# Altium footprint library PCBLIB.PcbLib: 557 footprints (part 8 of 36)
Each footprint in its own frame and in the unit in brackets; x right, y up, seen from the top. Pads: shape width x height; smd on the part's side, far side on the other; paste and mask are expansions set on the pad; w line width, h text height; cw(c..) or ccw(c..) is an arc to the next point about the centre after c.
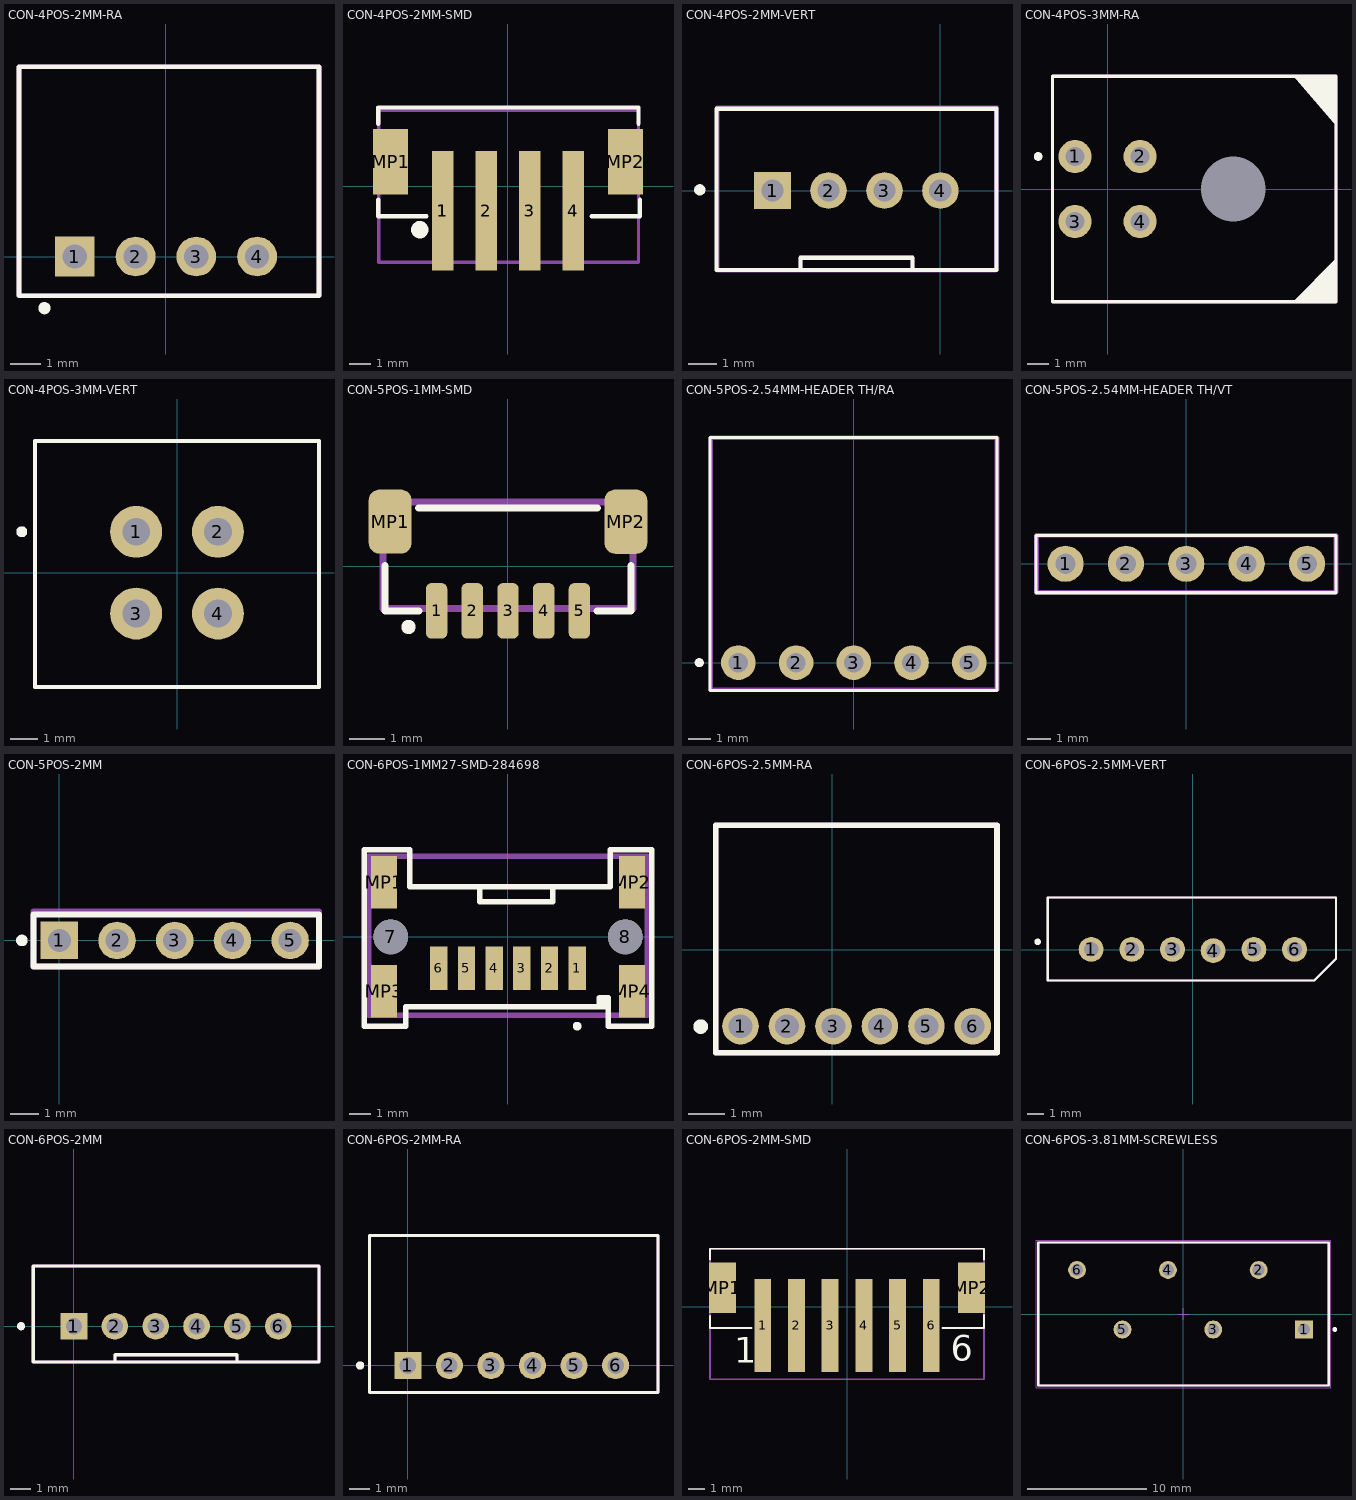
[diagram p7: the footprints below, top view; thin cyan lines are the x and y axes]

## CON-4POS-2MM-RA [mm]
pads (4):
  rect 1.308x1.308 hole 0.8: 1(-3,0)
  round 1.308 hole 0.8: 2(-1,0) 3(1,0) 4(3,0)
Top Overlay:
  circle w0.2: c-4,-1.7 r0.1
  lines w0.152: -4.838,-1.295 -4.838,6.248 5.039,6.248 5.039,-1.295 -4.838,-1.295
ASM Top:
  lines w0.152: -4.838,6.198 -4.788,6.248 5.039,6.248 5.039,-1.295 -4.838,-1.295 -4.838,6.248
  text ".designator" at -0.368,2.184 h0.8
3D body "S4B-PH-K-S.STEP": height 4.81, standoff -3.39, extent -4.861,-1.377 5.039,6.223

## CON-4POS-2MM-SMD [mm]
pads (7):
  rect 1x5.5 smd: 1(-3,-1.125) 1(-3,-1.125) 2(-1,-1.125) 3(1,-1.125) 4(3,-1.125)
  rect 1.6x3 smd: MP1(-5.4,1.125) MP2(5.4,1.125)
Top Overlay:
  circle w0.4: c-4.058,-1.999 r0.2
  lines w0.2: -5.975,-0.625 -5.975,-1.375 -3.75,-1.375 ; -5.975,2.875 -5.975,3.625 6,3.625 6,2.875 ; 3.85,-1.375 6.075,-1.375 6.075,-0.625
ASM Top:
  lines w0.152: -5.95,3.5 -5.95,-3.5 6,-3.5 6,3.5 ; -5.95,3.5 -5.95,3.5 ; -5.95,3.5 6,3.5 ; 6,3.5 6,3.5
  text ".designator" at -2.4,-0.4 h0.8
3D body "B4B-PH-SM4-TB.STEP": height 6.61, standoff 0.01, extent -5.95,-3.5 6,3.5

## CON-4POS-2MM-VERT [mm]
pads (4):
  rect 1.308x1.308 hole 0.8: 1(-6,0)
  round 1.308 hole 0.8: 2(-4,0) 3(-2,0) 4(0,0)
Top Overlay:
  circle w0.2: c-8.6,0.025 r0.1
  lines w0.15: -5,-2.845 -8,-2.845 -8,2.921 2,2.921 2,-2.845 -1,-2.845 ; -5,-2.845 -1,-2.845 ; -5,-2.845 -5,-2.4 -3.8,-2.4 -2.2,-2.4 -1,-2.4 -1,-2.845
ASM Top:
  lines w0.15: -5,-2.845 -5,-2.4 -1,-2.4 -1,-2.845
  lines w0.152: 1.97,-2.845 1.996,-2.819 ; 1.97,-2.845 -7.978,-2.845 -7.978,2.955 2.022,2.955 1.996,2.93 1.996,-2.819 ; 1.97,-2.845 1.996,-2.819
  text ".designator" at -4.727,-0.457 h0.8
3D body "c-1735446-4-c-3d.stp": height 6.1, standoff -3.37, extent -7.974,-2.844 2.026,2.956

## CON-4POS-3MM-RA [mil]
pads (5):
  round 60 hole 35: 1(-59.06,59.06) 2(59.06,59.06) 3(-59.06,-59.06) 4(59.06,-59.06)
  round 1 hole 118 unplated: MH1(228.35,0)
Top Overlay:
  circle w7.87: c-125.98,59.06 r3.94
  region: 415,-127 415,-205 337,-205
  region: 338.66,205 415,205 415,114.67
  lines w6: 345,205 415,205 ; 355,205 415,205 ; 415,205 -100,205 -100,-60 -100,-205 415,-205 415,205
ASM Top:
  lines w6: -100,-205 415,-205 415,205 -100,205 -100,-60 -100,-205
  text ".designator" at -55,114 h31.5
3D body "430450400.stp": height 340.35, standoff -130.12, extent -70,-199 411.89,200.6

## CON-4POS-3MM-VERT [mm]
pads (4):
  round 1.905 hole 1.016: 1(-1.5,1.5) 2(1.5,1.5) 3(-1.5,-1.5) 4(1.5,-1.5)
Top Overlay:
  circle w0.2: c-5.7,1.5 r0.1
  lines w0.152: -5.207,-4.191 5.207,-4.191 5.207,4.826 -5.207,4.826 -5.207,-4.191
ASM Top:
  lines w0.152: -5.207,-4.191 -5.207,4.826 5.207,4.826 5.207,-4.191 -5.207,-4.191
  text ".designator" at -4.775,2.718 h0.8
3D body "430450412.stp": height 10.03, standoff -3.06, extent -5.07,-4.064 5.08,4.706

## CON-5POS-1MM-SMD [mm]
pads (7):
  rrect50% 0.6x1.55 smd mask+0.05: 1(-2,-1.25) 2(-1,-1.25) 3(0,-1.25) 4(1,-1.25) 5(2,-1.25)
  rrect50% 1.2x1.8 smd mask+0.05: MP1(-3.3,1.25) MP2(3.3,1.249)
Top Overlay:
  circle w0.2: c-2.788,-1.7 r0.1
  lines w0.2: -3.442,0.015 -3.442,-1.251 -2.5,-1.251 ; -2.5,1.631 2.5,1.631 ; 2.5,-1.251 3.44,-1.251 ; 3.441,-1.253 3.441,0.013
ASM Top:
  lines w0.2: -3.5,-1.2 -3.5,1.8 3.5,1.8 3.5,-1.2 3.485,-1.185 -3.5,-1.185
  text ".designator" at -1.3,0 h0.8
3D body "5013310507.stp": height 5.5, standoff -0.04, extent -3.62,-1.91 3.62,1.94

## CON-5POS-2.54MM-HEADER TH/RA [mil]
pads (5):
  round 60 hole 33.46: 1(-200,0) 2(-100,0) 3(0,0) 4(100,0) 5(200,0)
Top Overlay:
  circle w7.87: c-267.72,0 r3.94
  lines w5: -249,-48 248,-48 248,389.76 -249,389.76 -249,-48
ASM Top:
  lines w7.87: -248.03,389.57 247.84,389.57 248.03,389.76 248.03,-47.24 -248.03,-47.24 -248.03,389.76
  text ".designator" at -51.18,188.98 h31.5
3D body "TSW-105-08-G-S-RA.stp": height 119.5, standoff -89.5, extent -250,-13.44 250,389.06

## CON-5POS-2.54MM-HEADER TH/VT [mil]
pads (5):
  round 60 hole 33.46: 1(-200,0) 2(-100,0) 3(0,0) 4(100,0) 5(200,0)
Top Overlay:
  lines w5: -249,-48 -249,47 248,47 248,-48 -249,-48
ASM Top:
  lines w7.87: -248.03,-47.24 -248.03,47.24 248.03,47.24 248.03,-47.24 -248.03,-47.24
  text ".designator" at -43.31,-11.81 h31.5
3D body "Header_Male_5Pin.STEP": height 336.22, standoff -118.11, extent -251,-50 249,48.03

## CON-5POS-2MM [mm] "Connector; Header; 5 Position"
pads (5):
  rect 1.3x1.3 hole 0.8: 1(0,0)
  round 1.3 hole 0.8: 2(2,0) 3(4,0) 4(6,0) 5(8,0)
Top Overlay:
  circle w0.2: c-1.3,0 r0.1
  lines w0.2: -0.9,-0.9 9,-0.9 9,0.9 -0.9,0.9 -0.9,-0.9
ASM Top:
  lines w0.2: -0.9,-0.9 9,-0.9 9,1 -0.9,1 -0.9,-0.9
  text ".designator" at 3.372,-0.169 h0.8

## CON-6POS-1MM27-SMD-284698 [mm] "ERNI 284698"
height 5.25
pads (12):
  rect 0.8x2 smd: 1(3.175,-1.45) 2(1.905,-1.45) 3(0.635,-1.45) 4(-0.635,-1.45) 5(-1.905,-1.45) 6(-3.175,-1.45)
  round 1.6 hole 1.6 unplated: 7(-5.385,0) 8(5.385,0)
  rect 1.2x2.4 smd: MP1(-5.685,2.5) MP2(5.685,2.5) MP3(-5.685,-2.5) MP4(5.685,-2.5)
Top Overlay:
  circle w0.2: c3.175,-4.1 r0.1
  lines w0.254: -1.305,2.3 -1.305,1.6 2.062,1.6 2.062,2.3 ; 4.16,-3.2 4.2,-3.2 4.2,-2.8 4.6,-2.8 4.6,-3.2 ; 4.4,-3 4.6,-3 4.6,-3.2 ; 4.6,-3.2 4.6,-4.1 6.6,-4.1 6.6,4 4.7,4 4.7,2.3 -4.5,2.3 -4.5,4 -6.6,4 -6.6,-4.1 -4.7,-4.1 -4.7,-3.2 4.6,-3.2
ASM Top:
  lines w0.254: -6.4,-3.6 6.4,-3.6 6.4,3.7 -6.4,3.7 -6.4,-3.6
  text ".designator" at -3.6,0.4 h0.8
3D body "284698.STEP": height 5.2, standoff -0.8, extent -6.345,-3.5 6.355,3.5

## CON-6POS-2.5MM-RA [mm]
pads (6):
  round 1 hole 0.65: 1(-2.51,-2.088) 2(-1.24,-2.088) 3(0.03,-2.088) 4(1.3,-2.088) 5(2.57,-2.088) 6(3.84,-2.088)
Top Overlay:
  circle w0.2: c-3.6,-2.1 r0.1
  lines w0.152: -3.192,-2.81 4.5,-2.81 4.5,3.4 -3.192,3.4 -3.192,-2.81
ASM Top:
  lines w0.152: -3.192,-2.81 4.5,-2.81 4.5,3.4 -3.192,3.4 -3.192,-2.81
  text ".designator" at 0,0.3 h0.8
3D body "M50-3930642.STEP": height 2.11, standoff -2.39, extent -3.192,-2.28 4.43,3.42

## CON-6POS-2.5MM-VERT [mil]
pads (6):
  round 60 hole 35: 1(-245,1.5) 2(-147,1.5) 3(-49,1.5) 4(49,-1.5) 5(147,1.5) 6(245,1.5)
Top Overlay:
  circle w7.87: c-374.02,19.68 r3.94
  lines w6: -350,-73.5 -350,126.5 345,126.5 345,-21.14 292.64,-73.5 -350,-73.5
ASM Top:
  lines w6: -350,-73.5 -350,126.5 345,126.5 345,-21.14 292.64,-73.5 -350,-73.5
  text ".designator" at -66.93,39.37 h31.5
3D body "022035065.stp": height 231.14, standoff -138.94, extent -344.04,-69.96 341,122.96

## CON-6POS-2MM [mm]
pads (6):
  rect 1.308x1.308 hole 0.8: 1(0,0)
  round 1.308 hole 0.8: 2(2.006,0) 3(4.013,0) 4(6.019,0) 5(8.026,0) 6(10.032,0)
Top Overlay:
  circle w0.2: c-2.6,0 r0.1
  lines w0.152: 2.019,-1.75 2.019,-1.4 8.013,-1.4 8.013,-1.75 ; -2,-1.75 12.032,-1.75 12.032,2.95 -2,2.95 -2,-1.75
ASM Top:
  lines w0.15: 2.019,-1.75 2.019,-1.4 8.013,-1.4 8.013,-1.75 ; -2,-1.75 -2,2.95 12.032,2.95 12.032,-1.75 -2,-1.75
  text ".designator" at 3.3,0.3 h0.8
3D body "c-440054-6-e6-3d.stp": height 6.1, standoff -3.35, extent -1.984,-1.75 12.016,2.95

## CON-6POS-2MM-RA [mm]
pads (6):
  rect 1.308x1.308 hole 0.8: 1(0,0)
  round 1.308 hole 0.8: 2(2,0) 3(4,0) 4(6,0) 5(8,0) 6(10,0)
Top Overlay:
  circle w0.2: c-2.3,0 r0.1
  lines w0.152: -1.839,-1.295 12.04,-1.295 12.04,6.248 -1.839,6.248 -1.839,-1.295
ASM Top:
  lines w0.152: -1.839,6.198 -1.788,6.248 12.04,6.248 12.04,-1.295 -1.839,-1.295 -1.839,6.248
  text ".designator" at 2.632,2.184 h0.8
3D body "S6B-PH-K-S.STEP": height 4.81, standoff -3.39, extent -1.839,-1.295 12.062,6.305

## CON-6POS-2MM-SMD [mm]
pads (8):
  rect 1x5.5 smd: 1(-5,-1.125) 2(-3,-1.125) 3(-1,-1.125) 4(1,-1.125) 5(3,-1.125) 6(5,-1.125)
  rect 1.6x3 smd mask+0.051: MP1(-7.4,1.125) MP2(7.4,1.125)
Top Overlay:
  lines w0.102: -8.128,-0.559 -8.128,-1.27 -5.664,-1.27 ; -8.128,2.794 -8.128,3.429 8.128,3.429 8.128,2.794 ; 5.664,-1.27 8.128,-1.27 8.128,-0.483
  text "6" at 6.147,-3.226 h1.52
  text "1" at -6.68,-3.327 h1.52
ASM Top:
  lines w0.102: -8.128,-4.318 8.128,-4.318 8.128,3.429 -8.128,3.429 -8.128,-4.318
  text ".designator" at -7.595,-1.168 h0.8
3D body "B6B-PH-SM4-TB.STEP": height 6.61, standoff 0.01, extent -8,-3.708 7.95,3.292

## CON-6POS-3.81MM-SCREWLESS [mm] "3.81mm 45¡ã Cable Entry Screwless, 6p"
height 13.2
pads (6):
  rect 1.5x1.5 hole 1: 1(10.12,-1.3)
  round 1.5 hole 1: 2(6.31,3.7) 3(2.5,-1.3) 4(-1.31,3.7) 5(-5.12,-1.3) 6(-8.93,3.7)
Top Overlay:
  circle w0.2: c12.7,-1.3 r0.1
  lines w0.2: -12.18,-6 12.18,-6 12.18,6 -12.18,6 -12.18,-6
Mechanical 13:
  lines w0.1: -12.18,-6 -12.18,6 12.18,6 12.18,-6 -12.18,-6
Mechanical 15:
  lines w0.05: -0.5,0 0.5,0 ; 0,-0.5 0,0.5 ; -12.38,-6.2 -12.38,6.2 12.38,6.2 12.38,-6.2 -12.38,-6.2
ASM Top:
  lines w0.2: -12.2,-6 12.2,-6 12.2,6 -12.2,6 -12.2,-6
  text ".designator" at 0,0.1 h0.8
3D body "691412320006.stp": height 13.28, standoff -3.52, extent -12.18,-6 12.18,6